# Altium integrated library WCAP-ATLI_rev15a.intlib: 161 symbols (part 2 of 2)
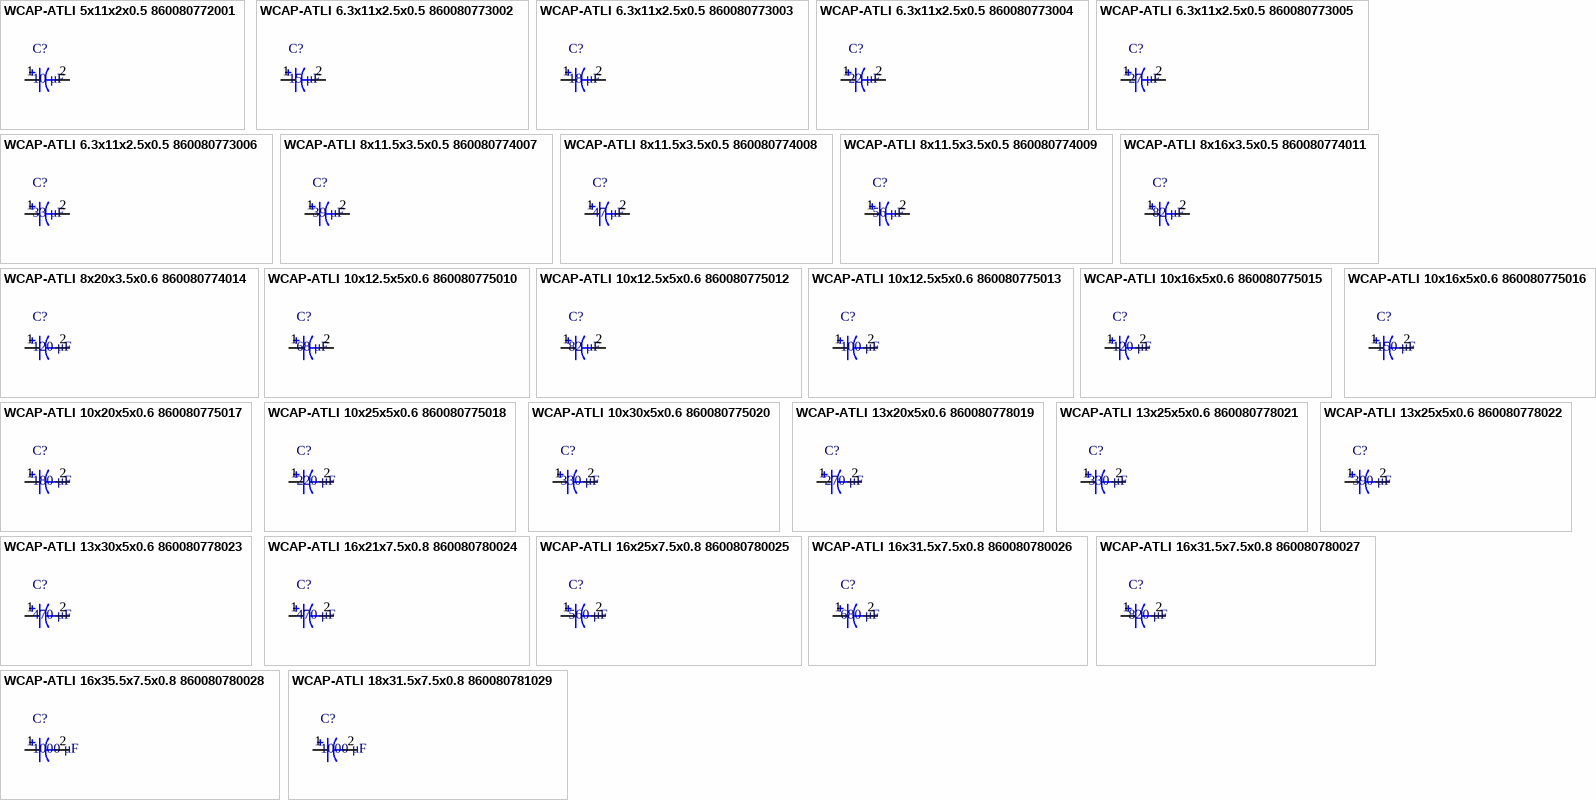
[diagram p6: symbols WCAP-ATLI 5x11x2x0.5 860080772001 to WCAP-ATLI 18x31.5x7.5x0.8 860080781029]

## WCAP-ATLI 5x11x2x0.5 860080772001
designator C?, comment 10 μF
WCAP-ATLI Aluminum Electrolytic Capacitors , 10 μF; + / - 20%; 63 V , 5 x 11; Manufacturer: Wurth Elektronik; partNo: 860080772001; E-mail: libraries@we-online.com; Characteristics: Aluminum Electrolytic Capacitor;Recommended soldering: Wave;Operating temperature: –55 °C to +105 °C;Low impedance product series;Load life: 2000–5000 h @ +105 °C; ComponentLink1Description: Manufacturer; ComponentLink1URL: http://www.we-online.com; ComponentLink2Description: Datasheet; ComponentLink2URL: http://katalog.we-online.de/pbs/datasheet/860080772001.pdf; Created by: Karrer Zheng; Created Date: 5/13/2015; Capacitance: 10 μF; Application: Applied to high frequency secondary side output filter loop, general switching power supply, DC-DC converter, AC-DC converter, adapter, charger, TV, VCR, DC motor circuit filter, LCD TV digital audio, digital TV, digital camera, digital video camera, satellite receiver and etc.
footprint WCAP-ATLI 5x11x2x0.5
pins: 1, 2

## WCAP-ATLI 6.3x11x2.5x0.5 860080773002
designator C?, comment 15 μF
WCAP-ATLI Aluminum Electrolytic Capacitors , 15 μF; + / - 20%; 63 V , 6,3 x 11; Manufacturer: Wurth Elektronik; partNo: 860080773002; E-mail: libraries@we-online.com; Characteristics: Aluminum Electrolytic Capacitor;Recommended soldering: Wave;Operating temperature: –55 °C to +105 °C;Low impedance product series;Load life: 2000–5000 h @ +105 °C; ComponentLink1Description: Manufacturer; ComponentLink1URL: http://www.we-online.com; ComponentLink2Description: Datasheet; ComponentLink2URL: http://katalog.we-online.de/pbs/datasheet/860080773002.pdf; Created by: Karrer Zheng; Created Date: 5/13/2015; Capacitance: 15 μF; Application: Applied to high frequency secondary side output filter loop, general switching power supply, DC-DC converter, AC-DC converter, adapter, charger, TV, VCR, DC motor circuit filter, LCD TV digital audio, digital TV, digital camera, digital video camera, satellite receiver and etc.
footprint WCAP-ATLI 6.3x11x2.5x0.5
pins: 1, 2

## WCAP-ATLI 6.3x11x2.5x0.5 860080773003
designator C?, comment 18 μF
WCAP-ATLI Aluminum Electrolytic Capacitors , 18 μF; + / - 20%; 63 V , 6,3 x 11; Manufacturer: Wurth Elektronik; partNo: 860080773003; E-mail: libraries@we-online.com; Characteristics: Aluminum Electrolytic Capacitor;Recommended soldering: Wave;Operating temperature: –55 °C to +105 °C;Low impedance product series;Load life: 2000–5000 h @ +105 °C; ComponentLink1Description: Manufacturer; ComponentLink1URL: http://www.we-online.com; ComponentLink2Description: Datasheet; ComponentLink2URL: http://katalog.we-online.de/pbs/datasheet/860080773003.pdf; Created by: Karrer Zheng; Created Date: 5/13/2015; Capacitance: 18 μF; Application: Applied to high frequency secondary side output filter loop, general switching power supply, DC-DC converter, AC-DC converter, adapter, charger, TV, VCR, DC motor circuit filter, LCD TV digital audio, digital TV, digital camera, digital video camera, satellite receiver and etc.
footprint WCAP-ATLI 6.3x11x2.5x0.5
pins: 1, 2

## WCAP-ATLI 6.3x11x2.5x0.5 860080773004
designator C?, comment 22 μF
WCAP-ATLI Aluminum Electrolytic Capacitors , 22 μF; + / - 20%; 63 V , 6,3 x 11; Manufacturer: Wurth Elektronik; partNo: 860080773004; E-mail: libraries@we-online.com; Characteristics: Aluminum Electrolytic Capacitor;Recommended soldering: Wave;Operating temperature: –55 °C to +105 °C;Low impedance product series;Load life: 2000–5000 h @ +105 °C; ComponentLink1Description: Manufacturer; ComponentLink1URL: http://www.we-online.com; ComponentLink2Description: Datasheet; ComponentLink2URL: http://katalog.we-online.de/pbs/datasheet/860080773004.pdf; Created by: Karrer Zheng; Created Date: 5/13/2015; Capacitance: 22 μF; Application: Applied to high frequency secondary side output filter loop, general switching power supply, DC-DC converter, AC-DC converter, adapter, charger, TV, VCR, DC motor circuit filter, LCD TV digital audio, digital TV, digital camera, digital video camera, satellite receiver and etc.
footprint WCAP-ATLI 6.3x11x2.5x0.5
pins: 1, 2

## WCAP-ATLI 6.3x11x2.5x0.5 860080773005
designator C?, comment 27 μF
WCAP-ATLI Aluminum Electrolytic Capacitors , 27 μF; + / - 20%; 63 V , 6,3 x 11; Manufacturer: Wurth Elektronik; partNo: 860080773005; E-mail: libraries@we-online.com; Characteristics: Aluminum Electrolytic Capacitor;Recommended soldering: Wave;Operating temperature: –55 °C to +105 °C;Low impedance product series;Load life: 2000–5000 h @ +105 °C; ComponentLink1Description: Manufacturer; ComponentLink1URL: http://www.we-online.com; ComponentLink2Description: Datasheet; ComponentLink2URL: http://katalog.we-online.de/pbs/datasheet/860080773005.pdf; Created by: Karrer Zheng; Created Date: 5/13/2015; Capacitance: 27 μF; Application: Applied to high frequency secondary side output filter loop, general switching power supply, DC-DC converter, AC-DC converter, adapter, charger, TV, VCR, DC motor circuit filter, LCD TV digital audio, digital TV, digital camera, digital video camera, satellite receiver and etc.
footprint WCAP-ATLI 6.3x11x2.5x0.5
pins: 1, 2

## WCAP-ATLI 6.3x11x2.5x0.5 860080773006
designator C?, comment 33 μF
WCAP-ATLI Aluminum Electrolytic Capacitors , 33 μF; + / - 20%; 63 V , 6,3 x 11; Manufacturer: Wurth Elektronik; partNo: 860080773006; E-mail: libraries@we-online.com; Characteristics: Aluminum Electrolytic Capacitor;Recommended soldering: Wave;Operating temperature: –55 °C to +105 °C;Low impedance product series;Load life: 2000–5000 h @ +105 °C; ComponentLink1Description: Manufacturer; ComponentLink1URL: http://www.we-online.com; ComponentLink2Description: Datasheet; ComponentLink2URL: http://katalog.we-online.de/pbs/datasheet/860080773006.pdf; Created by: Karrer Zheng; Created Date: 5/13/2015; Capacitance: 33 μF; Application: Applied to high frequency secondary side output filter loop, general switching power supply, DC-DC converter, AC-DC converter, adapter, charger, TV, VCR, DC motor circuit filter, LCD TV digital audio, digital TV, digital camera, digital video camera, satellite receiver and etc.
footprint WCAP-ATLI 6.3x11x2.5x0.5
pins: 1, 2

## WCAP-ATLI 8x11.5x3.5x0.5 860080774007
designator C?, comment 39 μF
WCAP-ATLI Aluminum Electrolytic Capacitors , 39 μF; + / - 20%; 63 V , 8 x 11,5; Manufacturer: Wurth Elektronik; partNo: 860080774007; E-mail: libraries@we-online.com; Characteristics: Aluminum Electrolytic Capacitor;Recommended soldering: Wave;Operating temperature: –55 °C to +105 °C;Low impedance product series;Load life: 2000–5000 h @ +105 °C; ComponentLink1Description: Manufacturer; ComponentLink1URL: http://www.we-online.com; ComponentLink2Description: Datasheet; ComponentLink2URL: http://katalog.we-online.de/pbs/datasheet/860080774007.pdf; Created by: Karrer Zheng; Created Date: 5/13/2015; Capacitance: 39 μF; Application: Applied to high frequency secondary side output filter loop, general switching power supply, DC-DC converter, AC-DC converter, adapter, charger, TV, VCR, DC motor circuit filter, LCD TV digital audio, digital TV, digital camera, digital video camera, satellite receiver and etc.
footprint WCAP-ATLI 8x11.5x3.5x0.5
pins: 1, 2

## WCAP-ATLI 8x11.5x3.5x0.5 860080774008
designator C?, comment 47 μF
WCAP-ATLI Aluminum Electrolytic Capacitors , 47 μF; + / - 20%; 63 V , 8 x 11,5; Manufacturer: Wurth Elektronik; partNo: 860080774008; E-mail: libraries@we-online.com; Characteristics: Aluminum Electrolytic Capacitor;Recommended soldering: Wave;Operating temperature: –55 °C to +105 °C;Low impedance product series;Load life: 2000–5000 h @ +105 °C; ComponentLink1Description: Manufacturer; ComponentLink1URL: http://www.we-online.com; ComponentLink2Description: Datasheet; ComponentLink2URL: http://katalog.we-online.de/pbs/datasheet/860080774008.pdf; Created by: Karrer Zheng; Created Date: 5/13/2015; Capacitance: 47 μF; Application: Applied to high frequency secondary side output filter loop, general switching power supply, DC-DC converter, AC-DC converter, adapter, charger, TV, VCR, DC motor circuit filter, LCD TV digital audio, digital TV, digital camera, digital video camera, satellite receiver and etc.
footprint WCAP-ATLI 8x11.5x3.5x0.5
pins: 1, 2

## WCAP-ATLI 8x11.5x3.5x0.5 860080774009
designator C?, comment 56 μF
WCAP-ATLI Aluminum Electrolytic Capacitors , 56 μF; + / - 20%; 63 V , 8 x 11,5; Manufacturer: Wurth Elektronik; partNo: 860080774009; E-mail: libraries@we-online.com; Characteristics: Aluminum Electrolytic Capacitor;Recommended soldering: Wave;Operating temperature: –55 °C to +105 °C;Low impedance product series;Load life: 2000–5000 h @ +105 °C; ComponentLink1Description: Manufacturer; ComponentLink1URL: http://www.we-online.com; ComponentLink2Description: Datasheet; ComponentLink2URL: http://katalog.we-online.de/pbs/datasheet/860080774009.pdf; Created by: Karrer Zheng; Created Date: 5/13/2015; Capacitance: 56 μF; Application: Applied to high frequency secondary side output filter loop, general switching power supply, DC-DC converter, AC-DC converter, adapter, charger, TV, VCR, DC motor circuit filter, LCD TV digital audio, digital TV, digital camera, digital video camera, satellite receiver and etc.
footprint WCAP-ATLI 8x11.5x3.5x0.5
pins: 1, 2

## WCAP-ATLI 8x16x3.5x0.5 860080774011
designator C?, comment 82 μF
WCAP-ATLI Aluminum Electrolytic Capacitors , 82 μF; + / - 20%; 63 V , 8 x 16; Manufacturer: Wurth Elektronik; partNo: 860080774011; E-mail: libraries@we-online.com; Characteristics: Aluminum Electrolytic Capacitor;Recommended soldering: Wave;Operating temperature: –55 °C to +105 °C;Low impedance product series;Load life: 2000–5000 h @ +105 °C; ComponentLink1Description: Manufacturer; ComponentLink1URL: http://www.we-online.com; ComponentLink2Description: Datasheet; ComponentLink2URL: http://katalog.we-online.de/pbs/datasheet/860080774011.pdf; Created by: Karrer Zheng; Created Date: 5/13/2015; Capacitance: 82 μF; Application: Applied to high frequency secondary side output filter loop, general switching power supply, DC-DC converter, AC-DC converter, adapter, charger, TV, VCR, DC motor circuit filter, LCD TV digital audio, digital TV, digital camera, digital video camera, satellite receiver and etc.
footprint WCAP-ATLI 8x16x3.5x0.5
pins: 1, 2

## WCAP-ATLI 8x20x3.5x0.6 860080774014
designator C?, comment 120 μF
WCAP-ATLI Aluminum Electrolytic Capacitors , 120 μF; + / - 20%; 63 V , 8 x 20; Manufacturer: Wurth Elektronik; partNo: 860080774014; E-mail: libraries@we-online.com; Characteristics: Aluminum Electrolytic Capacitor;Recommended soldering: Wave;Operating temperature: –55 °C to +105 °C;Low impedance product series;Load life: 2000–5000 h @ +105 °C; ComponentLink1Description: Manufacturer; ComponentLink1URL: http://www.we-online.com; ComponentLink2Description: Datasheet; ComponentLink2URL: http://katalog.we-online.de/pbs/datasheet/860080774014.pdf; Created by: Karrer Zheng; Created Date: 5/13/2015; Capacitance: 120 μF; Application: Applied to high frequency secondary side output filter loop, general switching power supply, DC-DC converter, AC-DC converter, adapter, charger, TV, VCR, DC motor circuit filter, LCD TV digital audio, digital TV, digital camera, digital video camera, satellite receiver and etc.
footprint WCAP-ATLI 8x20x3.5x0.6
pins: 1, 2

## WCAP-ATLI 10x12.5x5x0.6 860080775010
designator C?, comment 68 μF
WCAP-ATLI Aluminum Electrolytic Capacitors , 68 μF; + / - 20%; 63 V , 10 x 12,5; Manufacturer: Wurth Elektronik; partNo: 860080775010; E-mail: libraries@we-online.com; Characteristics: Aluminum Electrolytic Capacitor;Recommended soldering: Wave;Operating temperature: –55 °C to +105 °C;Low impedance product series;Load life: 2000–5000 h @ +105 °C; ComponentLink1Description: Manufacturer; ComponentLink1URL: http://www.we-online.com; ComponentLink2Description: Datasheet; ComponentLink2URL: http://katalog.we-online.de/pbs/datasheet/860080775010.pdf; Created by: Karrer Zheng; Created Date: 5/13/2015; Capacitance: 68 μF; Application: Applied to high frequency secondary side output filter loop, general switching power supply, DC-DC converter, AC-DC converter, adapter, charger, TV, VCR, DC motor circuit filter, LCD TV digital audio, digital TV, digital camera, digital video camera, satellite receiver and etc.
footprint WCAP-ATLI 10x12.5x5x0.6
pins: 1, 2

## WCAP-ATLI 10x12.5x5x0.6 860080775012
designator C?, comment 82 μF
WCAP-ATLI Aluminum Electrolytic Capacitors , 82 μF; + / - 20%; 63 V , 10 x 12,5; Manufacturer: Wurth Elektronik; partNo: 860080775012; E-mail: libraries@we-online.com; Characteristics: Aluminum Electrolytic Capacitor;Recommended soldering: Wave;Operating temperature: –55 °C to +105 °C;Low impedance product series;Load life: 2000–5000 h @ +105 °C; ComponentLink1Description: Manufacturer; ComponentLink1URL: http://www.we-online.com; ComponentLink2Description: Datasheet; ComponentLink2URL: http://katalog.we-online.de/pbs/datasheet/860080775012.pdf; Created by: Karrer Zheng; Created Date: 5/13/2015; Capacitance: 82 μF; Application: Applied to high frequency secondary side output filter loop, general switching power supply, DC-DC converter, AC-DC converter, adapter, charger, TV, VCR, DC motor circuit filter, LCD TV digital audio, digital TV, digital camera, digital video camera, satellite receiver and etc.
footprint WCAP-ATLI 10x12.5x5x0.6
pins: 1, 2

## WCAP-ATLI 10x12.5x5x0.6 860080775013
designator C?, comment 100 μF
WCAP-ATLI Aluminum Electrolytic Capacitors , 100 μF; + / - 20%; 63 V , 10 x 12,5; Manufacturer: Wurth Elektronik; partNo: 860080775013; E-mail: libraries@we-online.com; Characteristics: Aluminum Electrolytic Capacitor;Recommended soldering: Wave;Operating temperature: –55 °C to +105 °C;Low impedance product series;Load life: 2000–5000 h @ +105 °C; ComponentLink1Description: Manufacturer; ComponentLink1URL: http://www.we-online.com; ComponentLink2Description: Datasheet; ComponentLink2URL: http://katalog.we-online.de/pbs/datasheet/860080775013.pdf; Created by: Karrer Zheng; Created Date: 5/13/2015; Capacitance: 100 μF; Application: Applied to high frequency secondary side output filter loop, general switching power supply, DC-DC converter, AC-DC converter, adapter, charger, TV, VCR, DC motor circuit filter, LCD TV digital audio, digital TV, digital camera, digital video camera, satellite receiver and etc.
footprint WCAP-ATLI 10x12.5x5x0.6
pins: 1, 2

## WCAP-ATLI 10x16x5x0.6 860080775015
designator C?, comment 120 μF
WCAP-ATLI Aluminum Electrolytic Capacitors , 120 μF; + / - 20%; 63 V , 10 x 16; Manufacturer: Wurth Elektronik; partNo: 860080775015; E-mail: libraries@we-online.com; Characteristics: Aluminum Electrolytic Capacitor;Recommended soldering: Wave;Operating temperature: –55 °C to +105 °C;Low impedance product series;Load life: 2000–5000 h @ +105 °C; ComponentLink1Description: Manufacturer; ComponentLink1URL: http://www.we-online.com; ComponentLink2Description: Datasheet; ComponentLink2URL: http://katalog.we-online.de/pbs/datasheet/860080775015.pdf; Created by: Karrer Zheng; Created Date: 5/13/2015; Capacitance: 120 μF; Application: Applied to high frequency secondary side output filter loop, general switching power supply, DC-DC converter, AC-DC converter, adapter, charger, TV, VCR, DC motor circuit filter, LCD TV digital audio, digital TV, digital camera, digital video camera, satellite receiver and etc.
footprint WCAP-ATLI 10x16x5x0.6
pins: 1, 2

## WCAP-ATLI 10x16x5x0.6 860080775016
designator C?, comment 150 μF
WCAP-ATLI Aluminum Electrolytic Capacitors , 150 μF; + / - 20%; 63 V , 10 x 16; Manufacturer: Wurth Elektronik; partNo: 860080775016; E-mail: libraries@we-online.com; Characteristics: Aluminum Electrolytic Capacitor;Recommended soldering: Wave;Operating temperature: –55 °C to +105 °C;Low impedance product series;Load life: 2000–5000 h @ +105 °C; ComponentLink1Description: Manufacturer; ComponentLink1URL: http://www.we-online.com; ComponentLink2Description: Datasheet; ComponentLink2URL: http://katalog.we-online.de/pbs/datasheet/860080775016.pdf; Created by: Karrer Zheng; Created Date: 5/13/2015; Capacitance: 150 μF; Application: Applied to high frequency secondary side output filter loop, general switching power supply, DC-DC converter, AC-DC converter, adapter, charger, TV, VCR, DC motor circuit filter, LCD TV digital audio, digital TV, digital camera, digital video camera, satellite receiver and etc.
footprint WCAP-ATLI 10x16x5x0.6
pins: 1, 2

## WCAP-ATLI 10x20x5x0.6 860080775017
designator C?, comment 180 μF
WCAP-ATLI Aluminum Electrolytic Capacitors , 180 μF; + / - 20%; 63 V , 10 x 20; Manufacturer: Wurth Elektronik; partNo: 860080775017; E-mail: libraries@we-online.com; Characteristics: Aluminum Electrolytic Capacitor;Recommended soldering: Wave;Operating temperature: –55 °C to +105 °C;Low impedance product series;Load life: 2000–5000 h @ +105 °C; ComponentLink1Description: Manufacturer; ComponentLink1URL: http://www.we-online.com; ComponentLink2Description: Datasheet; ComponentLink2URL: http://katalog.we-online.de/pbs/datasheet/860080775017.pdf; Created by: Karrer Zheng; Created Date: 5/13/2015; Capacitance: 180 μF; Application: Applied to high frequency secondary side output filter loop, general switching power supply, DC-DC converter, AC-DC converter, adapter, charger, TV, VCR, DC motor circuit filter, LCD TV digital audio, digital TV, digital camera, digital video camera, satellite receiver and etc.
footprint WCAP-ATLI 10x20x5x0.6
pins: 1, 2

## WCAP-ATLI 10x25x5x0.6 860080775018
designator C?, comment 220 μF
WCAP-ATLI Aluminum Electrolytic Capacitors , 220 μF; + / - 20%; 63 V , 10 x 25; Manufacturer: Wurth Elektronik; partNo: 860080775018; E-mail: libraries@we-online.com; Characteristics: Aluminum Electrolytic Capacitor;Recommended soldering: Wave;Operating temperature: –55 °C to +105 °C;Low impedance product series;Load life: 2000–5000 h @ +105 °C; ComponentLink1Description: Manufacturer; ComponentLink1URL: http://www.we-online.com; ComponentLink2Description: Datasheet; ComponentLink2URL: http://katalog.we-online.de/pbs/datasheet/860080775018.pdf; Created by: Karrer Zheng; Created Date: 5/13/2015; Capacitance: 220 μF; Application: Applied to high frequency secondary side output filter loop, general switching power supply, DC-DC converter, AC-DC converter, adapter, charger, TV, VCR, DC motor circuit filter, LCD TV digital audio, digital TV, digital camera, digital video camera, satellite receiver and etc.
footprint WCAP-ATLI 10x25x5x0.6
pins: 1, 2

## WCAP-ATLI 10x30x5x0.6 860080775020
designator C?, comment 330 μF
WCAP-ATLI Aluminum Electrolytic Capacitors , 330 μF; + / - 20%; 63 V , 10 x 30; Manufacturer: Wurth Elektronik; partNo: 860080775020; E-mail: libraries@we-online.com; Characteristics: Aluminum Electrolytic Capacitor;Recommended soldering: Wave;Operating temperature: –55 °C to +105 °C;Low impedance product series;Load life: 2000–5000 h @ +105 °C; ComponentLink1Description: Manufacturer; ComponentLink1URL: http://www.we-online.com; ComponentLink2Description: Datasheet; ComponentLink2URL: http://katalog.we-online.de/pbs/datasheet/860080775020.pdf; Created by: Karrer Zheng; Created Date: 5/13/2015; Capacitance: 330 μF; Application: Applied to high frequency secondary side output filter loop, general switching power supply, DC-DC converter, AC-DC converter, adapter, charger, TV, VCR, DC motor circuit filter, LCD TV digital audio, digital TV, digital camera, digital video camera, satellite receiver and etc.
footprint WCAP-ATLI 10x30x5x0.6
pins: 1, 2

## WCAP-ATLI 13x20x5x0.6 860080778019
designator C?, comment 270 μF
WCAP-ATLI Aluminum Electrolytic Capacitors , 270 μF; + / - 20%; 63 V , 13 x 20; Manufacturer: Wurth Elektronik; partNo: 860080778019; E-mail: libraries@we-online.com; Characteristics: Aluminum Electrolytic Capacitor;Recommended soldering: Wave;Operating temperature: –55 °C to +105 °C;Low impedance product series;Load life: 2000–5000 h @ +105 °C; ComponentLink1Description: Manufacturer; ComponentLink1URL: http://www.we-online.com; ComponentLink2Description: Datasheet; ComponentLink2URL: http://katalog.we-online.de/pbs/datasheet/860080778019.pdf; Created by: Karrer Zheng; Created Date: 5/13/2015; Capacitance: 270 μF; Application: Applied to high frequency secondary side output filter loop, general switching power supply, DC-DC converter, AC-DC converter, adapter, charger, TV, VCR, DC motor circuit filter, LCD TV digital audio, digital TV, digital camera, digital video camera, satellite receiver and etc.
footprint WCAP-ATLI 13x20x5x0.6
pins: 1, 2

## WCAP-ATLI 13x25x5x0.6 860080778021
designator C?, comment 330 μF
WCAP-ATLI Aluminum Electrolytic Capacitors , 330 μF; + / - 20%; 63 V , 13 x 25; Manufacturer: Wurth Elektronik; partNo: 860080778021; E-mail: libraries@we-online.com; Characteristics: Aluminum Electrolytic Capacitor;Recommended soldering: Wave;Operating temperature: –55 °C to +105 °C;Low impedance product series;Load life: 2000–5000 h @ +105 °C; ComponentLink1Description: Manufacturer; ComponentLink1URL: http://www.we-online.com; ComponentLink2Description: Datasheet; ComponentLink2URL: http://katalog.we-online.de/pbs/datasheet/860080778021.pdf; Created by: Karrer Zheng; Created Date: 5/13/2015; Capacitance: 330 μF; Application: Applied to high frequency secondary side output filter loop, general switching power supply, DC-DC converter, AC-DC converter, adapter, charger, TV, VCR, DC motor circuit filter, LCD TV digital audio, digital TV, digital camera, digital video camera, satellite receiver and etc.
footprint WCAP-ATLI 13x25x5x0.6
pins: 1, 2

## WCAP-ATLI 13x25x5x0.6 860080778022
designator C?, comment 390 μF
WCAP-ATLI Aluminum Electrolytic Capacitors , 390 μF; + / - 20%; 63 V , 13 x 25; Manufacturer: Wurth Elektronik; partNo: 860080778022; E-mail: libraries@we-online.com; Characteristics: Aluminum Electrolytic Capacitor;Recommended soldering: Wave;Operating temperature: –55 °C to +105 °C;Low impedance product series;Load life: 2000–5000 h @ +105 °C; ComponentLink1Description: Manufacturer; ComponentLink1URL: http://www.we-online.com; ComponentLink2Description: Datasheet; ComponentLink2URL: http://katalog.we-online.de/pbs/datasheet/860080778022.pdf; Created by: Karrer Zheng; Created Date: 5/13/2015; Capacitance: 390 μF; Application: Applied to high frequency secondary side output filter loop, general switching power supply, DC-DC converter, AC-DC converter, adapter, charger, TV, VCR, DC motor circuit filter, LCD TV digital audio, digital TV, digital camera, digital video camera, satellite receiver and etc.
footprint WCAP-ATLI 13x25x5x0.6
pins: 1, 2

## WCAP-ATLI 13x30x5x0.6 860080778023
designator C?, comment 470 μF
WCAP-ATLI Aluminum Electrolytic Capacitors , 470 μF; + / - 20%; 63 V , 13 x 30; Manufacturer: Wurth Elektronik; partNo: 860080778023; E-mail: libraries@we-online.com; Characteristics: Aluminum Electrolytic Capacitor;Recommended soldering: Wave;Operating temperature: –55 °C to +105 °C;Low impedance product series;Load life: 2000–5000 h @ +105 °C; ComponentLink1Description: Manufacturer; ComponentLink1URL: http://www.we-online.com; ComponentLink2Description: Datasheet; ComponentLink2URL: http://katalog.we-online.de/pbs/datasheet/860080778023.pdf; Created by: Karrer Zheng; Created Date: 5/13/2015; Capacitance: 470 μF; Application: Applied to high frequency secondary side output filter loop, general switching power supply, DC-DC converter, AC-DC converter, adapter, charger, TV, VCR, DC motor circuit filter, LCD TV digital audio, digital TV, digital camera, digital video camera, satellite receiver and etc.
footprint WCAP-ATLI 13x30x5x0.6
pins: 1, 2

## WCAP-ATLI 16x21x7.5x0.8 860080780024
designator C?, comment 470 μF
WCAP-ATLI Aluminum Electrolytic Capacitors , 470 μF; + / - 20%; 63 V , 16 x 21; Manufacturer: Wurth Elektronik; partNo: 860080780024; E-mail: libraries@we-online.com; Characteristics: Aluminum Electrolytic Capacitor;Recommended soldering: Wave;Operating temperature: –55 °C to +105 °C;Low impedance product series;Load life: 2000–5000 h @ +105 °C; ComponentLink1Description: Manufacturer; ComponentLink1URL: http://www.we-online.com; ComponentLink2Description: Datasheet; ComponentLink2URL: http://katalog.we-online.de/pbs/datasheet/860080780024.pdf; Created by: Karrer Zheng; Created Date: 5/13/2015; Capacitance: 470 μF; Application: Applied to high frequency secondary side output filter loop, general switching power supply, DC-DC converter, AC-DC converter, adapter, charger, TV, VCR, DC motor circuit filter, LCD TV digital audio, digital TV, digital camera, digital video camera, satellite receiver and etc.
footprint WCAP-ATLI 16x21x7.5x0.8
pins: 1, 2

## WCAP-ATLI 16x25x7.5x0.8 860080780025
designator C?, comment 560 μF
WCAP-ATLI Aluminum Electrolytic Capacitors , 560 μF; + / - 20%; 63 V , 16 x 25; Manufacturer: Wurth Elektronik; partNo: 860080780025; E-mail: libraries@we-online.com; Characteristics: Aluminum Electrolytic Capacitor;Recommended soldering: Wave;Operating temperature: –55 °C to +105 °C;Low impedance product series;Load life: 2000–5000 h @ +105 °C; ComponentLink1Description: Manufacturer; ComponentLink1URL: http://www.we-online.com; ComponentLink2Description: Datasheet; ComponentLink2URL: http://katalog.we-online.de/pbs/datasheet/860080780025.pdf; Created by: Karrer Zheng; Created Date: 5/13/2015; Capacitance: 560 μF; Application: Applied to high frequency secondary side output filter loop, general switching power supply, DC-DC converter, AC-DC converter, adapter, charger, TV, VCR, DC motor circuit filter, LCD TV digital audio, digital TV, digital camera, digital video camera, satellite receiver and etc.
footprint WCAP-ATLI 16x25x7.5x0.8
pins: 1, 2

## WCAP-ATLI 16x31.5x7.5x0.8 860080780026
designator C?, comment 680 μF
WCAP-ATLI Aluminum Electrolytic Capacitors , 680 μF; + / - 20%; 63 V , 16 x 31,5; Manufacturer: Wurth Elektronik; partNo: 860080780026; E-mail: libraries@we-online.com; Characteristics: Aluminum Electrolytic Capacitor;Recommended soldering: Wave;Operating temperature: –55 °C to +105 °C;Low impedance product series;Load life: 2000–5000 h @ +105 °C; ComponentLink1Description: Manufacturer; ComponentLink1URL: http://www.we-online.com; ComponentLink2Description: Datasheet; ComponentLink2URL: http://katalog.we-online.de/pbs/datasheet/860080780026.pdf; Created by: Karrer Zheng; Created Date: 5/13/2015; Capacitance: 680 μF; Application: Applied to high frequency secondary side output filter loop, general switching power supply, DC-DC converter, AC-DC converter, adapter, charger, TV, VCR, DC motor circuit filter, LCD TV digital audio, digital TV, digital camera, digital video camera, satellite receiver and etc.
footprint WCAP-ATLI 16x31.5x7.5x0.8
pins: 1, 2

## WCAP-ATLI 16x31.5x7.5x0.8 860080780027
designator C?, comment 820 μF
WCAP-ATLI Aluminum Electrolytic Capacitors , 820 μF; + / - 20%; 63 V , 16 x 31,5; Manufacturer: Wurth Elektronik; partNo: 860080780027; E-mail: libraries@we-online.com; Characteristics: Aluminum Electrolytic Capacitor;Recommended soldering: Wave;Operating temperature: –55 °C to +105 °C;Low impedance product series;Load life: 2000–5000 h @ +105 °C; ComponentLink1Description: Manufacturer; ComponentLink1URL: http://www.we-online.com; ComponentLink2Description: Datasheet; ComponentLink2URL: http://katalog.we-online.de/pbs/datasheet/860080780027.pdf; Created by: Karrer Zheng; Created Date: 5/13/2015; Capacitance: 820 μF; Application: Applied to high frequency secondary side output filter loop, general switching power supply, DC-DC converter, AC-DC converter, adapter, charger, TV, VCR, DC motor circuit filter, LCD TV digital audio, digital TV, digital camera, digital video camera, satellite receiver and etc.
footprint WCAP-ATLI 16x31.5x7.5x0.8
pins: 1, 2

## WCAP-ATLI 16x35.5x7.5x0.8 860080780028
designator C?, comment 1000 μF
WCAP-ATLI Aluminum Electrolytic Capacitors , 1000 μF; + / - 20%; 63 V , 16 x 35,5; Manufacturer: Wurth Elektronik; partNo: 860080780028; E-mail: libraries@we-online.com; Characteristics: Aluminum Electrolytic Capacitor;Recommended soldering: Wave;Operating temperature: –55 °C to +105 °C;Low impedance product series;Load life: 2000–5000 h @ +105 °C; ComponentLink1Description: Manufacturer; ComponentLink1URL: http://www.we-online.com; ComponentLink2Description: Datasheet; ComponentLink2URL: http://katalog.we-online.de/pbs/datasheet/860080780028.pdf; Created by: Karrer Zheng; Created Date: 5/13/2015; Capacitance: 1000 μF; Application: Applied to high frequency secondary side output filter loop, general switching power supply, DC-DC converter, AC-DC converter, adapter, charger, TV, VCR, DC motor circuit filter, LCD TV digital audio, digital TV, digital camera, digital video camera, satellite receiver and etc.
footprint WCAP-ATLI 16x35.5x7.5x0.8
pins: 1, 2

## WCAP-ATLI 18x31.5x7.5x0.8 860080781029
designator C?, comment 1000 μF
WCAP-ATLI Aluminum Electrolytic Capacitors , 1000 μF; + / - 20%; 63 V , 18 x 31,5; Manufacturer: Wurth Elektronik; partNo: 860080781029; E-mail: libraries@we-online.com; Characteristics: Aluminum Electrolytic Capacitor;Recommended soldering: Wave;Operating temperature: –55 °C to +105 °C;Low impedance product series;Load life: 2000–5000 h @ +105 °C; ComponentLink1Description: Manufacturer; ComponentLink1URL: http://www.we-online.com; ComponentLink2Description: Datasheet; ComponentLink2URL: http://katalog.we-online.de/pbs/datasheet/860080781029.pdf; Created by: Karrer Zheng; Created Date: 5/13/2015; Capacitance: 1000 μF; Application: Applied to high frequency secondary side output filter loop, general switching power supply, DC-DC converter, AC-DC converter, adapter, charger, TV, VCR, DC motor circuit filter, LCD TV digital audio, digital TV, digital camera, digital video camera, satellite receiver and etc.
footprint WCAP-ATLI 18x31.5x7.5x0.8
pins: 1, 2


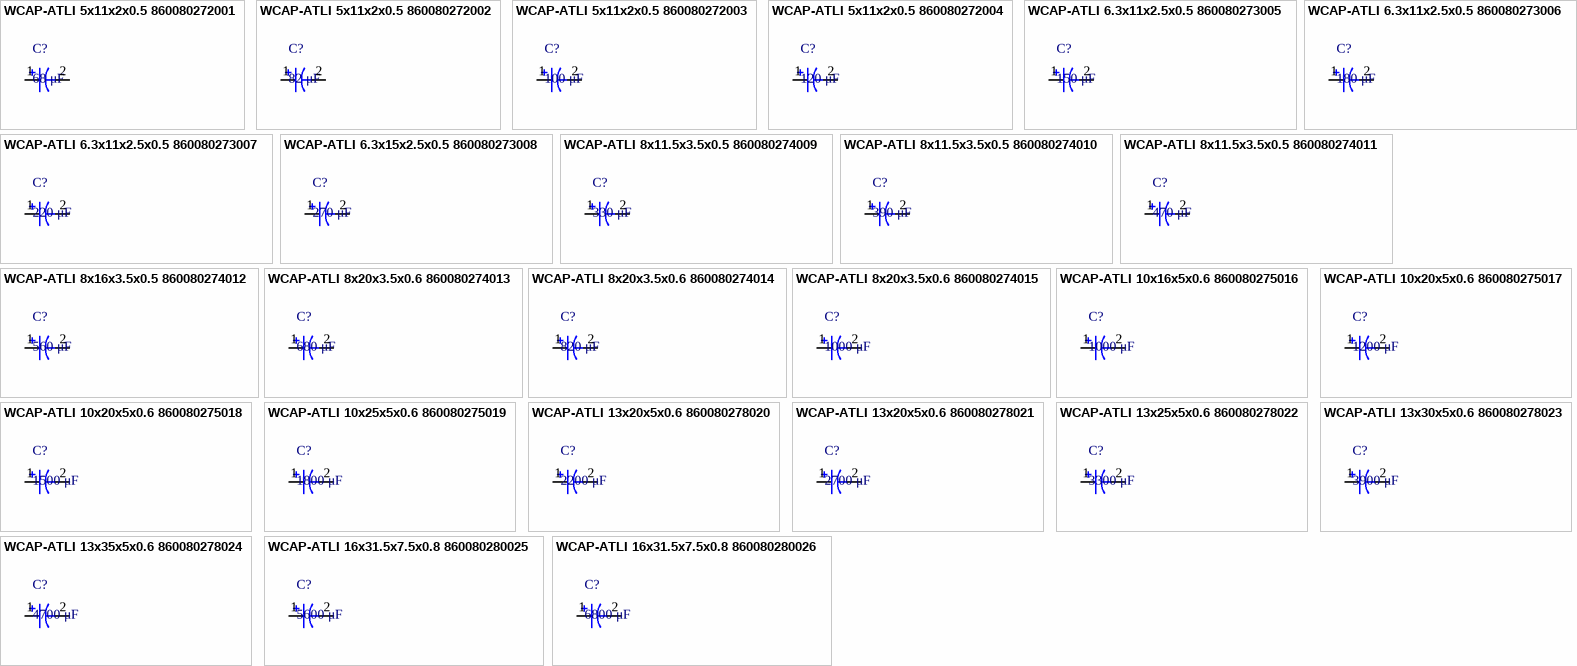
[diagram p5: symbols WCAP-ATLI 5x11x2x0.5 860080272001 to WCAP-ATLI 16x31.5x7.5x0.8 860080280026]

## WCAP-ATLI 5x11x2x0.5 860080272001
designator C?, comment 68 μF
WCAP-ATLI Aluminum Electrolytic Capacitors , 68 μF; + / - 20%; 10 V , 5 x 11; Manufacturer: Wurth Elektronik; partNo: 860080272001; E-mail: libraries@we-online.com; Characteristics: Aluminum Electrolytic Capacitor;Recommended soldering: Wave;Operating temperature: –55 °C to +105 °C;Low impedance product series;Load life: 2000–5000 h @ +105 °C; ComponentLink1Description: Manufacturer; ComponentLink1URL: http://www.we-online.com; ComponentLink2Description: Datasheet; ComponentLink2URL: http://katalog.we-online.de/pbs/datasheet/860080272001.pdf; Created by: Karrer Zheng; Created Date: 5/13/2015; Capacitance: 68 μF; Application: Applied to high frequency secondary side output filter loop, general switching power supply, DC-DC converter, AC-DC converter, adapter, charger, TV, VCR, DC motor circuit filter, LCD TV digital audio, digital TV, digital camera, digital video camera, satellite receiver and etc.
footprint WCAP-ATLI 5x11x2x0.5
pins: 1, 2

## WCAP-ATLI 5x11x2x0.5 860080272002
designator C?, comment 82 μF
WCAP-ATLI Aluminum Electrolytic Capacitors , 82 μF; + / - 20%; 10 V , 5 x 11; Manufacturer: Wurth Elektronik; partNo: 860080272002; E-mail: libraries@we-online.com; Characteristics: Aluminum Electrolytic Capacitor;Recommended soldering: Wave;Operating temperature: –55 °C to +105 °C;Low impedance product series;Load life: 2000–5000 h @ +105 °C; ComponentLink1Description: Manufacturer; ComponentLink1URL: http://www.we-online.com; ComponentLink2Description: Datasheet; ComponentLink2URL: http://katalog.we-online.de/pbs/datasheet/860080272002.pdf; Created by: Karrer Zheng; Created Date: 5/13/2015; Capacitance: 82 μF; Application: Applied to high frequency secondary side output filter loop, general switching power supply, DC-DC converter, AC-DC converter, adapter, charger, TV, VCR, DC motor circuit filter, LCD TV digital audio, digital TV, digital camera, digital video camera, satellite receiver and etc.
footprint WCAP-ATLI 5x11x2x0.5
pins: 1, 2

## WCAP-ATLI 5x11x2x0.5 860080272003
designator C?, comment 100 μF
WCAP-ATLI Aluminum Electrolytic Capacitors , 100 μF; + / - 20%; 10 V , 5 x 11; Manufacturer: Wurth Elektronik; partNo: 860080272003; E-mail: libraries@we-online.com; Characteristics: Aluminum Electrolytic Capacitor;Recommended soldering: Wave;Operating temperature: –55 °C to +105 °C;Low impedance product series;Load life: 2000–5000 h @ +105 °C; ComponentLink1Description: Manufacturer; ComponentLink1URL: http://www.we-online.com; ComponentLink2Description: Datasheet; ComponentLink2URL: http://katalog.we-online.de/pbs/datasheet/860080272003.pdf; Created by: Karrer Zheng; Created Date: 5/13/2015; Capacitance: 100 μF; Application: Applied to high frequency secondary side output filter loop, general switching power supply, DC-DC converter, AC-DC converter, adapter, charger, TV, VCR, DC motor circuit filter, LCD TV digital audio, digital TV, digital camera, digital video camera, satellite receiver and etc.
footprint WCAP-ATLI 5x11x2x0.5
pins: 1, 2

## WCAP-ATLI 5x11x2x0.5 860080272004
designator C?, comment 120 μF
WCAP-ATLI Aluminum Electrolytic Capacitors , 120 μF; + / - 20%; 10 V , 5 x 11; Manufacturer: Wurth Elektronik; partNo: 860080272004; E-mail: libraries@we-online.com; Characteristics: Aluminum Electrolytic Capacitor;Recommended soldering: Wave;Operating temperature: –55 °C to +105 °C;Low impedance product series;Load life: 2000–5000 h @ +105 °C; ComponentLink1Description: Manufacturer; ComponentLink1URL: http://www.we-online.com; ComponentLink2Description: Datasheet; ComponentLink2URL: http://katalog.we-online.de/pbs/datasheet/860080272004.pdf; Created by: Karrer Zheng; Created Date: 5/13/2015; Capacitance: 120 μF; Application: Applied to high frequency secondary side output filter loop, general switching power supply, DC-DC converter, AC-DC converter, adapter, charger, TV, VCR, DC motor circuit filter, LCD TV digital audio, digital TV, digital camera, digital video camera, satellite receiver and etc.
footprint WCAP-ATLI 5x11x2x0.5
pins: 1, 2

## WCAP-ATLI 6.3x11x2.5x0.5 860080273005
designator C?, comment 150 μF
WCAP-ATLI Aluminum Electrolytic Capacitors , 150 μF; + / - 20%; 10 V , 6,3 x 11; Manufacturer: Wurth Elektronik; partNo: 860080273005; E-mail: libraries@we-online.com; Characteristics: Aluminum Electrolytic Capacitor;Recommended soldering: Wave;Operating temperature: –55 °C to +105 °C;Low impedance product series;Load life: 2000–5000 h @ +105 °C; ComponentLink1Description: Manufacturer; ComponentLink1URL: http://www.we-online.com; ComponentLink2Description: Datasheet; ComponentLink2URL: http://katalog.we-online.de/pbs/datasheet/860080273005.pdf; Created by: Karrer Zheng; Created Date: 5/13/2015; Capacitance: 150 μF; Application: Applied to high frequency secondary side output filter loop, general switching power supply, DC-DC converter, AC-DC converter, adapter, charger, TV, VCR, DC motor circuit filter, LCD TV digital audio, digital TV, digital camera, digital video camera, satellite receiver and etc.
footprint WCAP-ATLI 6.3x11x2.5x0.5
pins: 1, 2

## WCAP-ATLI 6.3x11x2.5x0.5 860080273006
designator C?, comment 180 μF
WCAP-ATLI Aluminum Electrolytic Capacitors , 180 μF; + / - 20%; 10 V , 6,3 x 11; Manufacturer: Wurth Elektronik; partNo: 860080273006; E-mail: libraries@we-online.com; Characteristics: Aluminum Electrolytic Capacitor;Recommended soldering: Wave;Operating temperature: –55 °C to +105 °C;Low impedance product series;Load life: 2000–5000 h @ +105 °C; ComponentLink1Description: Manufacturer; ComponentLink1URL: http://www.we-online.com; ComponentLink2Description: Datasheet; ComponentLink2URL: http://katalog.we-online.de/pbs/datasheet/860080273006.pdf; Created by: Karrer Zheng; Created Date: 5/13/2015; Capacitance: 180 μF; Application: Applied to high frequency secondary side output filter loop, general switching power supply, DC-DC converter, AC-DC converter, adapter, charger, TV, VCR, DC motor circuit filter, LCD TV digital audio, digital TV, digital camera, digital video camera, satellite receiver and etc.
footprint WCAP-ATLI 6.3x11x2.5x0.5
pins: 1, 2

## WCAP-ATLI 6.3x11x2.5x0.5 860080273007
designator C?, comment 220 μF
WCAP-ATLI Aluminum Electrolytic Capacitors , 220 μF; + / - 20%; 10 V , 6,3 x 11; Manufacturer: Wurth Elektronik; partNo: 860080273007; E-mail: libraries@we-online.com; Characteristics: Aluminum Electrolytic Capacitor;Recommended soldering: Wave;Operating temperature: –55 °C to +105 °C;Low impedance product series;Load life: 2000–5000 h @ +105 °C; ComponentLink1Description: Manufacturer; ComponentLink1URL: http://www.we-online.com; ComponentLink2Description: Datasheet; ComponentLink2URL: http://katalog.we-online.de/pbs/datasheet/860080273007.pdf; Created by: Karrer Zheng; Created Date: 5/13/2015; Capacitance: 220 μF; Application: Applied to high frequency secondary side output filter loop, general switching power supply, DC-DC converter, AC-DC converter, adapter, charger, TV, VCR, DC motor circuit filter, LCD TV digital audio, digital TV, digital camera, digital video camera, satellite receiver and etc.
footprint WCAP-ATLI 6.3x11x2.5x0.5
pins: 1, 2

## WCAP-ATLI 6.3x15x2.5x0.5 860080273008
designator C?, comment 270 μF
WCAP-ATLI Aluminum Electrolytic Capacitors , 270 μF; + / - 20%; 10 V , 6,3 x 15; Manufacturer: Wurth Elektronik; partNo: 860080273008; E-mail: libraries@we-online.com; Characteristics: Aluminum Electrolytic Capacitor;Recommended soldering: Wave;Operating temperature: –55 °C to +105 °C;Low impedance product series;Load life: 2000–5000 h @ +105 °C; ComponentLink1Description: Manufacturer; ComponentLink1URL: http://www.we-online.com; ComponentLink2Description: Datasheet; ComponentLink2URL: http://katalog.we-online.de/pbs/datasheet/860080273008.pdf; Created by: Karrer Zheng; Created Date: 5/13/2015; Capacitance: 270 μF; Application: Applied to high frequency secondary side output filter loop, general switching power supply, DC-DC converter, AC-DC converter, adapter, charger, TV, VCR, DC motor circuit filter, LCD TV digital audio, digital TV, digital camera, digital video camera, satellite receiver and etc.
footprint WCAP-ATLI 6.3x15x2.5x0.5
pins: 1, 2

## WCAP-ATLI 8x11.5x3.5x0.5 860080274009
designator C?, comment 330 μF
WCAP-ATLI Aluminum Electrolytic Capacitors , 330 μF; + / - 20%; 10 V , 8 x 11,5; Manufacturer: Wurth Elektronik; partNo: 860080274009; E-mail: libraries@we-online.com; Characteristics: Aluminum Electrolytic Capacitor;Recommended soldering: Wave;Operating temperature: –55 °C to +105 °C;Low impedance product series;Load life: 2000–5000 h @ +105 °C; ComponentLink1Description: Manufacturer; ComponentLink1URL: http://www.we-online.com; ComponentLink2Description: Datasheet; ComponentLink2URL: http://katalog.we-online.de/pbs/datasheet/860080274009.pdf; Created by: Karrer Zheng; Created Date: 5/13/2015; Capacitance: 330 μF; Application: Applied to high frequency secondary side output filter loop, general switching power supply, DC-DC converter, AC-DC converter, adapter, charger, TV, VCR, DC motor circuit filter, LCD TV digital audio, digital TV, digital camera, digital video camera, satellite receiver and etc.
footprint WCAP-ATLI 8x11.5x3.5x0.5
pins: 1, 2

## WCAP-ATLI 8x11.5x3.5x0.5 860080274010
designator C?, comment 390 μF
WCAP-ATLI Aluminum Electrolytic Capacitors , 390 μF; + / - 20%; 10 V , 8 x 11,5; Manufacturer: Wurth Elektronik; partNo: 860080274010; E-mail: libraries@we-online.com; Characteristics: Aluminum Electrolytic Capacitor;Recommended soldering: Wave;Operating temperature: –55 °C to +105 °C;Low impedance product series;Load life: 2000–5000 h @ +105 °C; ComponentLink1Description: Manufacturer; ComponentLink1URL: http://www.we-online.com; ComponentLink2Description: Datasheet; ComponentLink2URL: http://katalog.we-online.de/pbs/datasheet/860080274010.pdf; Created by: Karrer Zheng; Created Date: 5/13/2015; Capacitance: 390 μF; Application: Applied to high frequency secondary side output filter loop, general switching power supply, DC-DC converter, AC-DC converter, adapter, charger, TV, VCR, DC motor circuit filter, LCD TV digital audio, digital TV, digital camera, digital video camera, satellite receiver and etc.
footprint WCAP-ATLI 8x11.5x3.5x0.5
pins: 1, 2

## WCAP-ATLI 8x11.5x3.5x0.5 860080274011
designator C?, comment 470 μF
WCAP-ATLI Aluminum Electrolytic Capacitors , 470 μF; + / - 20%; 10 V , 8 x 11,5; Manufacturer: Wurth Elektronik; partNo: 860080274011; E-mail: libraries@we-online.com; Characteristics: Aluminum Electrolytic Capacitor;Recommended soldering: Wave;Operating temperature: –55 °C to +105 °C;Low impedance product series;Load life: 2000–5000 h @ +105 °C; ComponentLink1Description: Manufacturer; ComponentLink1URL: http://www.we-online.com; ComponentLink2Description: Datasheet; ComponentLink2URL: http://katalog.we-online.de/pbs/datasheet/860080274011.pdf; Created by: Karrer Zheng; Created Date: 5/13/2015; Capacitance: 470 μF; Application: Applied to high frequency secondary side output filter loop, general switching power supply, DC-DC converter, AC-DC converter, adapter, charger, TV, VCR, DC motor circuit filter, LCD TV digital audio, digital TV, digital camera, digital video camera, satellite receiver and etc.
footprint WCAP-ATLI 8x11.5x3.5x0.5
pins: 1, 2

## WCAP-ATLI 8x16x3.5x0.5 860080274012
designator C?, comment 560 μF
WCAP-ATLI Aluminum Electrolytic Capacitors , 560 μF; + / - 20%; 10 V , 8 x 16; Manufacturer: Wurth Elektronik; partNo: 860080274012; E-mail: libraries@we-online.com; Characteristics: Aluminum Electrolytic Capacitor;Recommended soldering: Wave;Operating temperature: –55 °C to +105 °C;Low impedance product series;Load life: 2000–5000 h @ +105 °C; ComponentLink1Description: Manufacturer; ComponentLink1URL: http://www.we-online.com; ComponentLink2Description: Datasheet; ComponentLink2URL: http://katalog.we-online.de/pbs/datasheet/860080274012.pdf; Created by: Karrer Zheng; Created Date: 5/13/2015; Capacitance: 560 μF; Application: Applied to high frequency secondary side output filter loop, general switching power supply, DC-DC converter, AC-DC converter, adapter, charger, TV, VCR, DC motor circuit filter, LCD TV digital audio, digital TV, digital camera, digital video camera, satellite receiver and etc.
footprint WCAP-ATLI 8x16x3.5x0.5
pins: 1, 2

## WCAP-ATLI 8x20x3.5x0.6 860080274013
designator C?, comment 680 μF
WCAP-ATLI Aluminum Electrolytic Capacitors , 680 μF; + / - 20%; 10 V , 8 x 20; Manufacturer: Wurth Elektronik; partNo: 860080274013; E-mail: libraries@we-online.com; Characteristics: Aluminum Electrolytic Capacitor;Recommended soldering: Wave;Operating temperature: –55 °C to +105 °C;Low impedance product series;Load life: 2000–5000 h @ +105 °C; ComponentLink1Description: Manufacturer; ComponentLink1URL: http://www.we-online.com; ComponentLink2Description: Datasheet; ComponentLink2URL: http://katalog.we-online.de/pbs/datasheet/860080274013.pdf; Created by: Karrer Zheng; Created Date: 5/13/2015; Capacitance: 680 μF; Application: Applied to high frequency secondary side output filter loop, general switching power supply, DC-DC converter, AC-DC converter, adapter, charger, TV, VCR, DC motor circuit filter, LCD TV digital audio, digital TV, digital camera, digital video camera, satellite receiver and etc.
footprint WCAP-ATLI 8x20x3.5x0.6
pins: 1, 2

## WCAP-ATLI 8x20x3.5x0.6 860080274014
designator C?, comment 820 μF
WCAP-ATLI Aluminum Electrolytic Capacitors , 820 μF; + / - 20%; 10 V , 8 x 20; Manufacturer: Wurth Elektronik; partNo: 860080274014; E-mail: libraries@we-online.com; Characteristics: Aluminum Electrolytic Capacitor;Recommended soldering: Wave;Operating temperature: –55 °C to +105 °C;Low impedance product series;Load life: 2000–5000 h @ +105 °C; ComponentLink1Description: Manufacturer; ComponentLink1URL: http://www.we-online.com; ComponentLink2Description: Datasheet; ComponentLink2URL: http://katalog.we-online.de/pbs/datasheet/860080274014.pdf; Created by: Karrer Zheng; Created Date: 5/13/2015; Capacitance: 820 μF; Application: Applied to high frequency secondary side output filter loop, general switching power supply, DC-DC converter, AC-DC converter, adapter, charger, TV, VCR, DC motor circuit filter, LCD TV digital audio, digital TV, digital camera, digital video camera, satellite receiver and etc.
footprint WCAP-ATLI 8x20x3.5x0.6
pins: 1, 2

## WCAP-ATLI 8x20x3.5x0.6 860080274015
designator C?, comment 1000 μF
WCAP-ATLI Aluminum Electrolytic Capacitors , 1000 μF; + / - 20%; 10 V , 8 x 20; Manufacturer: Wurth Elektronik; partNo: 860080274015; E-mail: libraries@we-online.com; Characteristics: Aluminum Electrolytic Capacitor;Recommended soldering: Wave;Operating temperature: –55 °C to +105 °C;Low impedance product series;Load life: 2000–5000 h @ +105 °C; ComponentLink1Description: Manufacturer; ComponentLink1URL: http://www.we-online.com; ComponentLink2Description: Datasheet; ComponentLink2URL: http://katalog.we-online.de/pbs/datasheet/860080274015.pdf; Created by: Karrer Zheng; Created Date: 5/13/2015; Capacitance: 1000 μF; Application: Applied to high frequency secondary side output filter loop, general switching power supply, DC-DC converter, AC-DC converter, adapter, charger, TV, VCR, DC motor circuit filter, LCD TV digital audio, digital TV, digital camera, digital video camera, satellite receiver and etc.
footprint WCAP-ATLI 8x20x3.5x0.6
pins: 1, 2

## WCAP-ATLI 10x16x5x0.6 860080275016
designator C?, comment 1000 μF
WCAP-ATLI Aluminum Electrolytic Capacitors , 1000 μF; + / - 20%; 10 V , 10 x 16; Manufacturer: Wurth Elektronik; partNo: 860080275016; E-mail: libraries@we-online.com; Characteristics: Aluminum Electrolytic Capacitor;Recommended soldering: Wave;Operating temperature: –55 °C to +105 °C;Low impedance product series;Load life: 2000–5000 h @ +105 °C; ComponentLink1Description: Manufacturer; ComponentLink1URL: http://www.we-online.com; ComponentLink2Description: Datasheet; ComponentLink2URL: http://katalog.we-online.de/pbs/datasheet/860080275016.pdf; Created by: Karrer Zheng; Created Date: 5/13/2015; Capacitance: 1000 μF; Application: Applied to high frequency secondary side output filter loop, general switching power supply, DC-DC converter, AC-DC converter, adapter, charger, TV, VCR, DC motor circuit filter, LCD TV digital audio, digital TV, digital camera, digital video camera, satellite receiver and etc.
footprint WCAP-ATLI 10x16x5x0.6
pins: 1, 2

## WCAP-ATLI 10x20x5x0.6 860080275017
designator C?, comment 1200 μF
WCAP-ATLI Aluminum Electrolytic Capacitors , 1200 μF; + / - 20%; 10 V , 10 x 20; Manufacturer: Wurth Elektronik; partNo: 860080275017; E-mail: libraries@we-online.com; Characteristics: Aluminum Electrolytic Capacitor;Recommended soldering: Wave;Operating temperature: –55 °C to +105 °C;Low impedance product series;Load life: 2000–5000 h @ +105 °C; ComponentLink1Description: Manufacturer; ComponentLink1URL: http://www.we-online.com; ComponentLink2Description: Datasheet; ComponentLink2URL: http://katalog.we-online.de/pbs/datasheet/860080275017.pdf; Created by: Karrer Zheng; Created Date: 5/13/2015; Capacitance: 1200 μF; Application: Applied to high frequency secondary side output filter loop, general switching power supply, DC-DC converter, AC-DC converter, adapter, charger, TV, VCR, DC motor circuit filter, LCD TV digital audio, digital TV, digital camera, digital video camera, satellite receiver and etc.
footprint WCAP-ATLI 10x20x5x0.6
pins: 1, 2

## WCAP-ATLI 10x20x5x0.6 860080275018
designator C?, comment 1500 μF
WCAP-ATLI Aluminum Electrolytic Capacitors , 1500 μF; + / - 20%; 10 V , 10 x 20; Manufacturer: Wurth Elektronik; partNo: 860080275018; E-mail: libraries@we-online.com; Characteristics: Aluminum Electrolytic Capacitor;Recommended soldering: Wave;Operating temperature: –55 °C to +105 °C;Low impedance product series;Load life: 2000–5000 h @ +105 °C; ComponentLink1Description: Manufacturer; ComponentLink1URL: http://www.we-online.com; ComponentLink2Description: Datasheet; ComponentLink2URL: http://katalog.we-online.de/pbs/datasheet/860080275018.pdf; Created by: Karrer Zheng; Created Date: 5/13/2015; Capacitance: 1500 μF; Application: Applied to high frequency secondary side output filter loop, general switching power supply, DC-DC converter, AC-DC converter, adapter, charger, TV, VCR, DC motor circuit filter, LCD TV digital audio, digital TV, digital camera, digital video camera, satellite receiver and etc.
footprint WCAP-ATLI 10x20x5x0.6
pins: 1, 2

## WCAP-ATLI 10x25x5x0.6 860080275019
designator C?, comment 1800 μF
WCAP-ATLI Aluminum Electrolytic Capacitors , 1800 μF; + / - 20%; 10 V , 10 x 25; Manufacturer: Wurth Elektronik; partNo: 860080275019; E-mail: libraries@we-online.com; Characteristics: Aluminum Electrolytic Capacitor;Recommended soldering: Wave;Operating temperature: –55 °C to +105 °C;Low impedance product series;Load life: 2000–5000 h @ +105 °C; ComponentLink1Description: Manufacturer; ComponentLink1URL: http://www.we-online.com; ComponentLink2Description: Datasheet; ComponentLink2URL: http://katalog.we-online.de/pbs/datasheet/860080275019.pdf; Created by: Karrer Zheng; Created Date: 5/13/2015; Capacitance: 1800 μF; Application: Applied to high frequency secondary side output filter loop, general switching power supply, DC-DC converter, AC-DC converter, adapter, charger, TV, VCR, DC motor circuit filter, LCD TV digital audio, digital TV, digital camera, digital video camera, satellite receiver and etc.
footprint WCAP-ATLI 10x25x5x0.6
pins: 1, 2

## WCAP-ATLI 13x20x5x0.6 860080278020
designator C?, comment 2200 μF
WCAP-ATLI Aluminum Electrolytic Capacitors , 2200 μF; + / - 20%; 10 V , 13 x 20; Manufacturer: Wurth Elektronik; partNo: 860080278020; E-mail: libraries@we-online.com; Characteristics: Aluminum Electrolytic Capacitor;Recommended soldering: Wave;Operating temperature: –55 °C to +105 °C;Low impedance product series;Load life: 2000–5000 h @ +105 °C; ComponentLink1Description: Manufacturer; ComponentLink1URL: http://www.we-online.com; ComponentLink2Description: Datasheet; ComponentLink2URL: http://katalog.we-online.de/pbs/datasheet/860080278020.pdf; Created by: Karrer Zheng; Created Date: 5/13/2015; Capacitance: 2200 μF; Application: Applied to high frequency secondary side output filter loop, general switching power supply, DC-DC converter, AC-DC converter, adapter, charger, TV, VCR, DC motor circuit filter, LCD TV digital audio, digital TV, digital camera, digital video camera, satellite receiver and etc.
footprint WCAP-ATLI 13x20x5x0.6
pins: 1, 2

## WCAP-ATLI 13x20x5x0.6 860080278021
designator C?, comment 2700 μF
WCAP-ATLI Aluminum Electrolytic Capacitors , 2700 μF; + / - 20%; 10 V , 13 x 20; Manufacturer: Wurth Elektronik; partNo: 860080278021; E-mail: libraries@we-online.com; Characteristics: Aluminum Electrolytic Capacitor;Recommended soldering: Wave;Operating temperature: –55 °C to +105 °C;Low impedance product series;Load life: 2000–5000 h @ +105 °C; ComponentLink1Description: Manufacturer; ComponentLink1URL: http://www.we-online.com; ComponentLink2Description: Datasheet; ComponentLink2URL: http://katalog.we-online.de/pbs/datasheet/860080278021.pdf; Created by: Karrer Zheng; Created Date: 5/13/2015; Capacitance: 2700 μF; Application: Applied to high frequency secondary side output filter loop, general switching power supply, DC-DC converter, AC-DC converter, adapter, charger, TV, VCR, DC motor circuit filter, LCD TV digital audio, digital TV, digital camera, digital video camera, satellite receiver and etc.
footprint WCAP-ATLI 13x20x5x0.6
pins: 1, 2

## WCAP-ATLI 13x25x5x0.6 860080278022
designator C?, comment 3300 μF
WCAP-ATLI Aluminum Electrolytic Capacitors , 3300 μF; + / - 20%; 10 V , 13 x 25; Manufacturer: Wurth Elektronik; partNo: 860080278022; E-mail: libraries@we-online.com; Characteristics: Aluminum Electrolytic Capacitor;Recommended soldering: Wave;Operating temperature: –55 °C to +105 °C;Low impedance product series;Load life: 2000–5000 h @ +105 °C; ComponentLink1Description: Manufacturer; ComponentLink1URL: http://www.we-online.com; ComponentLink2Description: Datasheet; ComponentLink2URL: http://katalog.we-online.de/pbs/datasheet/860080278022.pdf; Created by: Karrer Zheng; Created Date: 5/13/2015; Capacitance: 3300 μF; Application: Applied to high frequency secondary side output filter loop, general switching power supply, DC-DC converter, AC-DC converter, adapter, charger, TV, VCR, DC motor circuit filter, LCD TV digital audio, digital TV, digital camera, digital video camera, satellite receiver and etc.
footprint WCAP-ATLI 13x25x5x0.6
pins: 1, 2

## WCAP-ATLI 13x30x5x0.6 860080278023
designator C?, comment 3900 μF
WCAP-ATLI Aluminum Electrolytic Capacitors , 3900 μF; + / - 20%; 10 V , 13 x 30; Manufacturer: Wurth Elektronik; partNo: 860080278023; E-mail: libraries@we-online.com; Characteristics: Aluminum Electrolytic Capacitor;Recommended soldering: Wave;Operating temperature: –55 °C to +105 °C;Low impedance product series;Load life: 2000–5000 h @ +105 °C; ComponentLink1Description: Manufacturer; ComponentLink1URL: http://www.we-online.com; ComponentLink2Description: Datasheet; ComponentLink2URL: http://katalog.we-online.de/pbs/datasheet/860080278023.pdf; Created by: Karrer Zheng; Created Date: 5/13/2015; Capacitance: 3900 μF; Application: Applied to high frequency secondary side output filter loop, general switching power supply, DC-DC converter, AC-DC converter, adapter, charger, TV, VCR, DC motor circuit filter, LCD TV digital audio, digital TV, digital camera, digital video camera, satellite receiver and etc.
footprint WCAP-ATLI 13x30x5x0.6
pins: 1, 2

## WCAP-ATLI 13x35x5x0.6 860080278024
designator C?, comment 4700 μF
WCAP-ATLI Aluminum Electrolytic Capacitors , 4700 μF; + / - 20%; 10 V , 13 x 35; Manufacturer: Wurth Elektronik; partNo: 860080278024; E-mail: libraries@we-online.com; Characteristics: Aluminum Electrolytic Capacitor;Recommended soldering: Wave;Operating temperature: –55 °C to +105 °C;Low impedance product series;Load life: 2000–5000 h @ +105 °C; ComponentLink1Description: Manufacturer; ComponentLink1URL: http://www.we-online.com; ComponentLink2Description: Datasheet; ComponentLink2URL: http://katalog.we-online.de/pbs/datasheet/860080278024.pdf; Created by: Karrer Zheng; Created Date: 5/13/2015; Capacitance: 4700 μF; Application: Applied to high frequency secondary side output filter loop, general switching power supply, DC-DC converter, AC-DC converter, adapter, charger, TV, VCR, DC motor circuit filter, LCD TV digital audio, digital TV, digital camera, digital video camera, satellite receiver and etc.
footprint WCAP-ATLI 13x35x5x0.6
pins: 1, 2

## WCAP-ATLI 16x31.5x7.5x0.8 860080280025
designator C?, comment 5600 μF
WCAP-ATLI Aluminum Electrolytic Capacitors , 5600 μF; + / - 20%; 10 V , 16 x 31,5; Manufacturer: Wurth Elektronik; partNo: 860080280025; E-mail: libraries@we-online.com; Characteristics: Aluminum Electrolytic Capacitor;Recommended soldering: Wave;Operating temperature: –55 °C to +105 °C;Low impedance product series;Load life: 2000–5000 h @ +105 °C; ComponentLink1Description: Manufacturer; ComponentLink1URL: http://www.we-online.com; ComponentLink2Description: Datasheet; ComponentLink2URL: http://katalog.we-online.de/pbs/datasheet/860080280025.pdf; Created by: Karrer Zheng; Created Date: 5/13/2015; Capacitance: 5600 μF; Application: Applied to high frequency secondary side output filter loop, general switching power supply, DC-DC converter, AC-DC converter, adapter, charger, TV, VCR, DC motor circuit filter, LCD TV digital audio, digital TV, digital camera, digital video camera, satellite receiver and etc.
footprint WCAP-ATLI 16x31.5x7.5x0.8
pins: 1, 2

## WCAP-ATLI 16x31.5x7.5x0.8 860080280026
designator C?, comment 6800 μF
WCAP-ATLI Aluminum Electrolytic Capacitors , 6800 μF; + / - 20%; 10 V , 16 x 31,5; Manufacturer: Wurth Elektronik; partNo: 860080280026; E-mail: libraries@we-online.com; Characteristics: Aluminum Electrolytic Capacitor;Recommended soldering: Wave;Operating temperature: –55 °C to +105 °C;Low impedance product series;Load life: 2000–5000 h @ +105 °C; ComponentLink1Description: Manufacturer; ComponentLink1URL: http://www.we-online.com; ComponentLink2Description: Datasheet; ComponentLink2URL: http://katalog.we-online.de/pbs/datasheet/860080280026.pdf; Created by: Karrer Zheng; Created Date: 5/13/2015; Capacitance: 6800 μF; Application: Applied to high frequency secondary side output filter loop, general switching power supply, DC-DC converter, AC-DC converter, adapter, charger, TV, VCR, DC motor circuit filter, LCD TV digital audio, digital TV, digital camera, digital video camera, satellite receiver and etc.
footprint WCAP-ATLI 16x31.5x7.5x0.8
pins: 1, 2